# Altium footprint library Emirhan's.PcbLib: 51 footprints (part 1 of 4)
Each footprint in its own frame and in the unit in brackets; x right, y up, seen from the top. Pads: shape width x height; smd on the part's side, far side on the other; paste and mask are expansions set on the pad; w line width, h text height; cw(c..) or ccw(c..) is an arc to the next point about the centre after c.
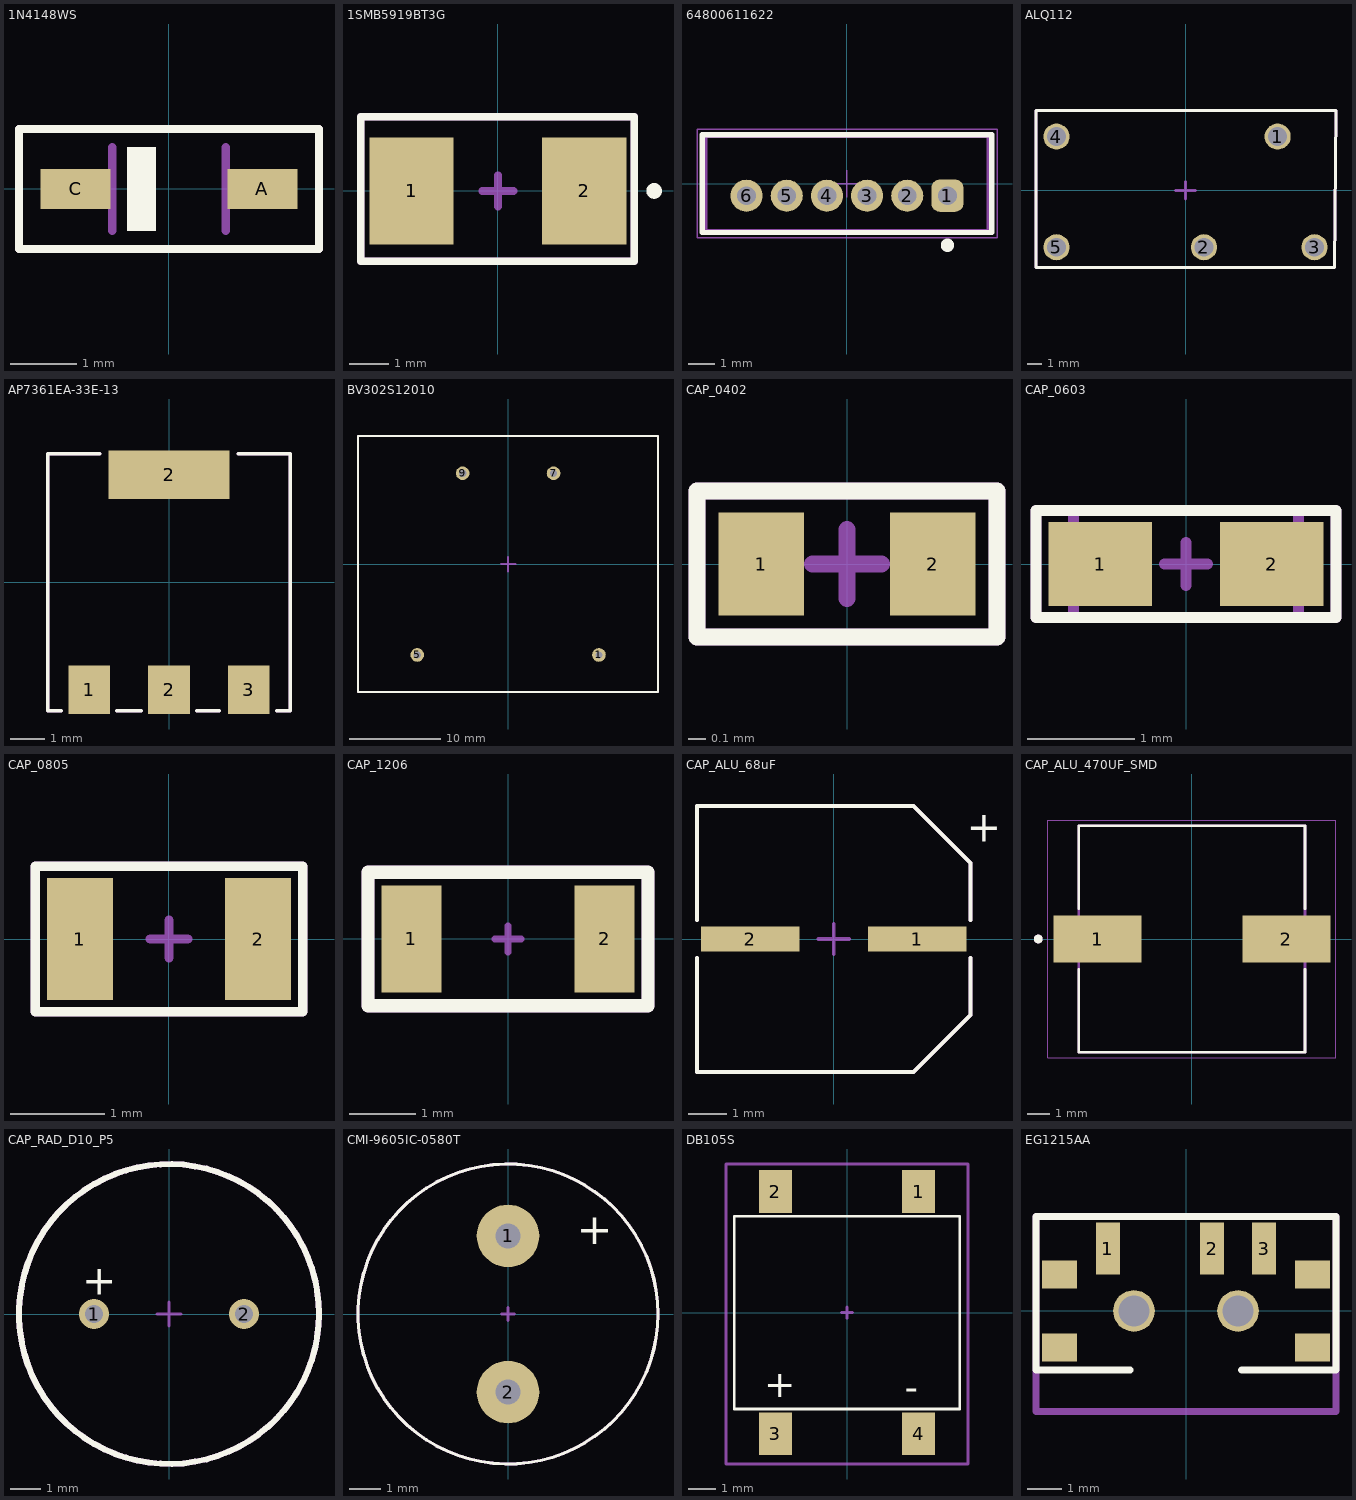
[diagram p0: the footprints below, top view; thin cyan lines are the x and y axes]

## 1N4148WS [mm]
pads (2):
  rect 1.05x0.6 smd: A(1.4,0) C(-1.4,0)
Top Overlay:
  region: -0.2,-0.625 -0.625,-0.625 -0.625,0.625 -0.2,0.625
  lines w0.127: -2.25,-0.9 2.25,-0.9 2.25,0.9 -2.25,0.9 -2.25,-0.9
Top 3D Body:
  lines w0.127: -2.25,-0.9 2.25,-0.9 2.25,0.9 -2.25,0.9 -2.25,-0.9
Top Designator:
  lines w0.127: -2.25,-0.9 2.25,-0.9 2.25,0.9 -2.25,0.9 -2.25,-0.9
  text ".Designator" at 0.433,-0.7 h0.8
Mechanical 13:
  lines w0.127: -0.85,-0.625 -0.85,0.625 ; 0.85,-0.625 0.85,0.625
3D body "step_temp.STEP": height 1.1, standoff 0.1, extent -1.25,-0.625 1.25,0.625

## 1SMB5919BT3G [mm]
pads (2):
  rect 2.159x2.743 smd mask+0.05: 1(-2.21,0) 2(2.21,0)
Top Overlay:
  circle w0.2: c4,0 r0.1
  lines w0.2: -3.51,-1.8 3.49,-1.8 3.49,1.9 -3.51,1.9 -3.51,-1.8
Top 3D Body:
  lines w0.2: -3.51,-1.8 3.49,-1.8 3.49,1.9 -3.51,1.9 -3.51,-1.8
Top Component Center:
  lines w0.2: -0.4,0 0.4,0 ; 0,-0.4 0,0.4
Top Designator:
  lines w0.2: -3.51,-1.8 3.49,-1.8 3.49,1.9 -3.51,1.9 -3.51,-1.8
  text ".Designator" at 0.333,-0.9 h0.8
3D body "1SMB5919BT3G.STEP": height 2.39, standoff -0.08, extent -2.73,-1.66 2.71,1.9

## 64800611622 [mm] "1.50mm Male Vertical Shrouded Header, 6p"
height 4.5
pads (6):
  rrect50% 1.2x1.2 hole 0.7: 1(3.75,-0.45)
  round 1.2 hole 0.7: 2(2.25,-0.45) 3(0.75,-0.45) 4(-0.75,-0.45) 5(-2.25,-0.45) 6(-3.75,-0.45)
Top Overlay:
  circle w0.25: c3.75,-2.3 r0.125
  lines w0.2: -5.4,-1.825 -5.4,1.825 5.4,1.825 5.4,-1.825 -5.4,-1.825
Top Component Center:
  lines w0.05: -0.5,0 0.5,0 ; 0,-0.5 0,0.5
Top Designator:
  text ".Designator" at -4.698,0.367 h1
Top Courtyard:
  lines w0.05: -5.6,-2.025 5.6,-2.025 5.6,2.025 -5.6,2.025 -5.6,-2.025
Top Component Outline:
  lines w0.1: -5.25,-1.75 5.25,-1.75 5.25,1.75 -5.25,1.75 -5.25,-1.75
3D body "64800611622.stp": height 4.53, standoff -2.67, extent -5.25,-1.75 5.25,1.75

## ALQ112 [mm]
pads (5):
  round 1.8 hole 1.3 mask+0.05: 1(6.35,3.71) 2(1.27,-3.91) 3(8.89,-3.91) 4(-8.89,3.71) 5(-8.89,-3.91)
Top Overlay:
  lines w0.2: -10.3,-5.3 -10.3,5.5 10.369,5.5 10.269,-5.3 -10.3,-5.3
Top 3D Body:
  lines w0.2: -10.3,-5.3 10.269,-5.3 10.369,5.5 -10.3,5.5 -10.3,-5.3
Top Component Center:
  lines w0.2: -0.7,0 0.7,0 ; 0,-0.6 0,0.6 ; -10.3,-5.3 10.269,-5.3 10.369,5.5 -10.3,5.5 -10.3,-5.3
Top Designator:
  lines w0.2: -10.3,-5.3 10.269,-5.3 10.369,5.5 -10.3,5.5 -10.3,-5.3
  text ".Designator" at -1.6,-0.233 h0.8
3D body "ALQ112--3DModel-STEP-56544.STEP": height 16, standoff -3.8, extent -10,-5 10,5

## AP7361EA-33E-13 [mm]
pads (4):
  rect 1.2x1.4 smd mask+0.05: 1(-2.3,-3.1) 2(0,-3.1) 3(2.3,-3.1)
  rect 3.5x1.4 smd mask+0.05: 2(0,3.1)
Top Overlay:
  lines w0.1: -3.1,-3.7 -3.5,-3.7 -3.5,3.7 -2,3.7 ; -1.5,-3.7 -0.8,-3.7 ; 0.8,-3.7 1.45,-3.7 ; 2,3.7 3.5,3.7 3.5,-3.7 3.1,-3.7
Top 3D Body:
  lines w0.1: -3.1,-3.7 -3.5,-3.7 -3.5,3.7 -2,3.7 ; -1.5,-3.7 -0.8,-3.7 ; 0.8,-3.7 1.45,-3.7 ; 2,3.7 3.5,3.7 3.5,-3.7 3.1,-3.7
Top Component Center:
  lines w0.1: -3.1,-3.7 -3.5,-3.7 -3.5,3.7 -2,3.7 ; -1.5,-3.7 -0.8,-3.7 ; 0.8,-3.7 1.45,-3.7 ; 2,3.7 3.5,3.7 3.5,-3.7 3.1,-3.7
Top Designator:
  lines w0.1: -3.1,-3.7 -3.5,-3.7 -3.5,3.7 -2,3.7 ; -1.5,-3.7 -0.8,-3.7 ; 0.8,-3.7 1.45,-3.7 ; 2,3.7 3.5,3.7 3.5,-3.7 3.1,-3.7
  text ".Designator" at -1.6,-0.733 h0.8
3D body "CircuitWorks-SOT-223.step": height 1.65, standoff -0.03, extent -3.25,-3.48 3.25,3.48

## BV302S12010 [mm]
pads (4):
  round 1.5 hole 0.8 mask+0.05: 1(10,-10) 5(-10,-10) 7(5,10) 9(-5,10)
Top Overlay:
  lines w0.2: -16.522,-14.078 16.5,-14.078 16.5,14.1 -16.522,14.1 -16.522,-14.078
Top 3D Body:
  lines w0.2: -16.522,-14.078 -16.522,14.1 16.5,14.1 16.5,-14.078 -16.522,-14.078
Top Component Center:
  lines w0.2: -0.8,0 0.8,0 ; 0,-0.8 0,0.8 ; -16.522,-14.078 16.5,-14.078 16.5,14.1 -16.522,14.1 -16.522,-14.078
Top Designator:
  lines w0.2: -16.522,-14.078 -16.522,14.1 16.5,14.1 16.5,-14.078 -16.522,-14.078
  text ".Designator" at -2.9,-2.133 h0.8
3D body "User Library-Hahn BV EI 302 2902.step": height 21.8, standoff -4.5, extent -16.25,-13.75 16.25,13.75

## CAP_0402 [mm]
pads (2):
  rect 0.5x0.6 smd mask+0.05: 1(-0.5,0) 2(0.5,0)
Top Overlay:
  lines w0.1: -0.875,-0.425 0.875,-0.425 0.875,0.425 -0.875,0.425 -0.875,-0.425
Top 3D Body:
  lines w0.1: -0.875,-0.425 0.875,-0.425 0.875,0.425 -0.875,0.425 -0.875,-0.425
Top Component Center:
  lines w0.1: -0.2,0 0.2,0 ; 0,-0.2 0,0.2 ; -0.875,-0.425 0.875,-0.425 0.875,0.425 -0.875,0.425 -0.875,-0.425
Top Designator:
  lines w0.1: -0.875,-0.425 -0.875,0.425 0.875,0.425 0.875,-0.425 -0.875,-0.425
  text ".Designator" at 0.233,-0.9 h0.5

## CAP_0603 [mil]
pads (2):
  rect 38x31 smd mask+1.97: 1(-31.5,0) 2(31.5,0)
Top Overlay:
  lines w3.94: -55.12,-19.68 -55.12,19.68 55.12,19.68 55.12,-19.68 -55.12,-19.68
Top 3D Body:
  lines w3.94: -41.34,-19.68 41.34,-19.68 41.34,19.68 -41.34,19.68 -41.34,-19.68
Top Component Center:
  lines w3.94: -7.87,0 7.87,0 ; 0,-7.87 0,7.87 ; -55.12,-19.68 55.12,-19.68 55.12,19.68 -55.12,19.68 -55.12,-19.68
Top Designator:
  lines w3.94: -55.12,-19.68 55.12,-19.68 55.12,19.68 -55.12,19.68 -55.12,-19.68
  text ".Designator" at 6.56,-98.39 h19.68
3D body "CAPC0603.STEP": height 31.5, standoff 0, extent -41.35,-19.68 41.35,20.82

## CAP_0805 [mm]
pads (2):
  rect 0.7x1.3 smd mask+0.05: 1(-0.95,0) 2(0.95,0)
Top Overlay:
  lines w0.1: -1.425,-0.775 1.425,-0.775 1.425,0.775 -1.425,0.775 -1.425,-0.775
Top 3D Body:
  lines w0.1: -1.425,-0.775 1.425,-0.775 1.425,0.775 -1.425,0.775 -1.425,-0.775
Top Component Center:
  lines w0.1: -0.2,0 0.2,0 ; 0,-0.2 0,0.2
Top Designator:
  lines w0.1: -1.425,-0.775 1.425,-0.775 1.425,0.775 -1.425,0.775 -1.425,-0.775
  text ".Designator" at 0.233,-0.6 h0.5
3D body "GCM2165C2A151JA16D.STEP": height 1.22, standoff -0.03, extent -1,-0.725 1,0.725

## CAP_1206 [mm]
pads (2):
  rect 0.9x1.6 smd mask+0.05: 1(-1.45,0) 2(1.45,0)
Top Overlay:
  lines w0.2: -2.1,-1 2.1,-1 2.1,1 -2.1,1 -2.1,-1
Top 3D Body:
  lines w0.2: -2.1,-1 -2.1,1 2.1,1 2.1,-1 -2.1,-1
Top Component Center:
  lines w0.1: -0.2,0 0.2,0 ; 0,-0.2 0,0.2
  lines w0.2: -2.1,-1 2.1,-1 2.1,1 -2.1,1 -2.1,-1
Top Designator:
  lines w0.2: -2.1,-1 2.1,-1 2.1,1 -2.1,1 -2.1,-1
  text ".Designator" at -0.8,-0.633 h0.8
3D body "GRM31C5C2A104JA01L.STEP": height 1.6, standoff 0, extent -1.6,-0.9 1.6,0.9

## CAP_ALU_68uF [mm]
pads (2):
  rect 2.6x0.65 smd mask+0.05: 1(2.2,0) 2(-2.2,0)
Top Overlay:
  lines w0.1: -3.6,-0.5 -3.6,-3.5 2.1,-3.5 3.6,-2 3.6,-0.5 ; -3.6,0.5 -3.6,3.5 2.1,3.5 3.6,2 3.6,0.5
  text "+" at 3.5,2.567 h0.8
Top 3D Body:
  lines w0.1: -3.6,-0.5 -3.6,-3.5 2.1,-3.5 3.6,-2 3.6,-0.5 ; -3.6,0.5 -3.6,3.5 2.1,3.5 3.6,2 3.6,0.5
Top Component Center:
  lines w0.1: -3.6,-0.5 -3.6,-3.5 2.1,-3.5 3.6,-2 3.6,-0.5 ; -3.6,0.5 -3.6,3.5 2.1,3.5 3.6,2 3.6,0.5 ; -0.4,0 0.4,0 ; 0,-0.4 0,0.4
Top Designator:
  lines w0.1: -3.6,-0.5 -3.6,-3.5 2.1,-3.5 3.6,-2 3.6,-0.5 ; -3.6,0.5 -3.6,3.5 2.1,3.5 3.6,2 3.6,0.5
  text ".Designator" at -1,-1.833 h0.8
3D body "EEV686M035A9HAA.step": height 7.71, standoff -0.3, extent -3.8,-3.4 3.8,3.4

## CAP_ALU_470UF_SMD [mm]
height 12.7
pads (2):
  rect 4.01x2.12 smd: 1(-4.3,0) 2(4.3,0)
Top Overlay:
  circle w0.2: c-7,0 r0.1
  lines w0.127: -5.15,-1.38 -5.15,-5.15 5.15,-5.15 5.15,-1.38 ; -5.15,1.38 -5.15,5.15 5.15,5.15 5.15,1.38
Top Designator:
  lines w0.05: -6.555,-5.4 6.555,-5.4 6.555,5.4 -6.555,5.4 -6.555,-5.4
  text ".Designator" at -1,-0.167 h0.4
Mechanical 13:
  circle w0.2: c-7,0 r0.1
  lines w0.127: -5.15,-5.15 -5.15,5.15 5.15,5.15 5.15,-5.15 -5.15,-5.15
3D body "CAP_PC_10X12P7_NCH.step": height 12.75, standoff 0, extent -5.601,-5.156 5.601,5.156

## CAP_RAD_D10_P5 [mm]
pads (2):
  round 1 hole 0.6 mask+0.05: 1(-2.5,0) 2(2.5,0)
Top Overlay:
  circle w0.2: c0,0 r5
  text "+" at -2.9,0.633 h1
Top 3D Body:
  circle w0.2: c0,0 r5
Top Component Center:
  circle w0.2: c0,0 r5
  lines w0.1: -0.4,0 0.4,0 ; 0,-0.4 0,0.4
Top Designator:
  circle w0.2: c0,0 r5
  text ".Designator" at -1.1,-1.433 h0.8
3D body "ESH477M050AH4AA.step": height 22, standoff -20, extent -5.25,-5.25 5.25,5.25

## CMI-9605IC-0580T [mm]
pads (2):
  round 2 hole 0.8 mask+0.05: 1(0,2.5) 2(0,-2.5)
Top Overlay:
  circle w0.1: c0,0 r4.8
  text "+" at 2.2,2.233 h1
Top Component Center:
  circle w0.1: c0,0 r4.8
  lines w0.1: -0.2,0 0.2,0 ; 0,-0.2 0,0.2
Top Designator:
  circle w0.1: c0,0 r4.8
  text ".Designator" at -2.4,-0.167 h1
3D body: height 5.1, standoff 0.1, extent -4.8,-4.8 4.8,4.8
3D body: height 5.16, standoff 5.11, extent -4,-4 4,4
3D body: height 5.16, standoff 5.11, extent -2,2 2,6
3D body: height 1.65, standoff -3.85, extent -0.3,-2.8 0.3,-2.2
3D body: height 0.15, standoff -5.35, extent -0.3,2.2 0.3,2.8

## DB105S [mm]
pads (4):
  rect 1.2x1.55 smd mask+0.05: 1(2.605,4.4) 2(-2.605,4.4) 3(-2.605,-4.4) 4(2.605,-4.4)
Top Overlay:
  lines w0.1: -4.1,-3.5 4.1,-3.5 4.1,3.5 -4.1,3.5 -4.1,-3.5
  text "-" at 2.1,-3.2 h1
  text "+" at -3,-3.067 h1
Top 3D Body:
  lines w0.1: -4.4,-5.5 4.4,-5.5 4.4,5.4 -4.4,5.4 -4.4,-5.5
Top Component Center:
  lines w0.1: -0.2,0 0.2,0 ; 0,-0.2 0,0.2 ; -4.4,-5.5 -4.4,5.4 ; -4.4,-5.5 4.4,-5.5 ; -4.4,-5.5 4.4,-5.5 ; -4.4,-5.5 -4.4,5.4 ; -4.4,5.4 4.4,5.4 ; -4.4,5.4 4.4,5.4 ; 4.4,-5.5 4.4,5.4 ; 4.4,-5.5 4.4,5.4
Top Designator:
  lines w0.1: -4.4,-5.5 4.4,-5.5 4.4,5.4 -4.4,5.4 -4.4,-5.5
  text ".Designator" at -2.2,0.533 h1
3D body "User Library-DB107S  DB-S.step": height 2.66, standoff 0, extent -4.16,-5.2 4.16,5.2

## EG1215AA [mm]
pads (9):
  rect 0.7x1.5 smd mask+0.05: 1(-2.25,1.8) 2(0.75,1.8) 3(2.25,1.8)
  rect 1x0.8 smd mask+0.05: ""(-3.65,-1.05) ""(-3.65,1.05) ""(3.65,-1.05) ""(3.65,1.05)
  round 1.2 hole 0.9 mask+0.05: ""(-1.5,0) ""(1.5,0)
Top Overlay:
  lines w0.2: -1.607,-1.7 -4.325,-1.7 -4.325,2.725 4.325,2.725 4.325,-1.7 ; 1.6,-1.7 4.318,-1.7
Top 3D Body:
  lines w0.2: -4.325,-2.9 4.325,-2.9 4.325,2.725 -4.325,2.725 -4.325,-2.9
Top Designator:
  lines w0.2: -4.325,-2.9 -4.325,2.725 4.325,2.725 4.325,-2.9 -4.325,-2.9
  text ".Designator" at -1.2,-1.833 h0.8
3D body "EG1215AA--3DModel-STEP-1.STEP": height 1.4, standoff -0.3, extent -3.85,-2.7 3.85,2.2